# Altium footprint library ICs And Semiconductors THD.PcbLib: 507 footprints (part 13 of 32)
Each footprint in its own frame and in the unit in brackets; x right, y up, seen from the top. Pads: shape width x height; smd on the part's side, far side on the other; paste and mask are expansions set on the pad; w line width, h text height; cw(c..) or ccw(c..) is an arc to the next point about the centre after c.
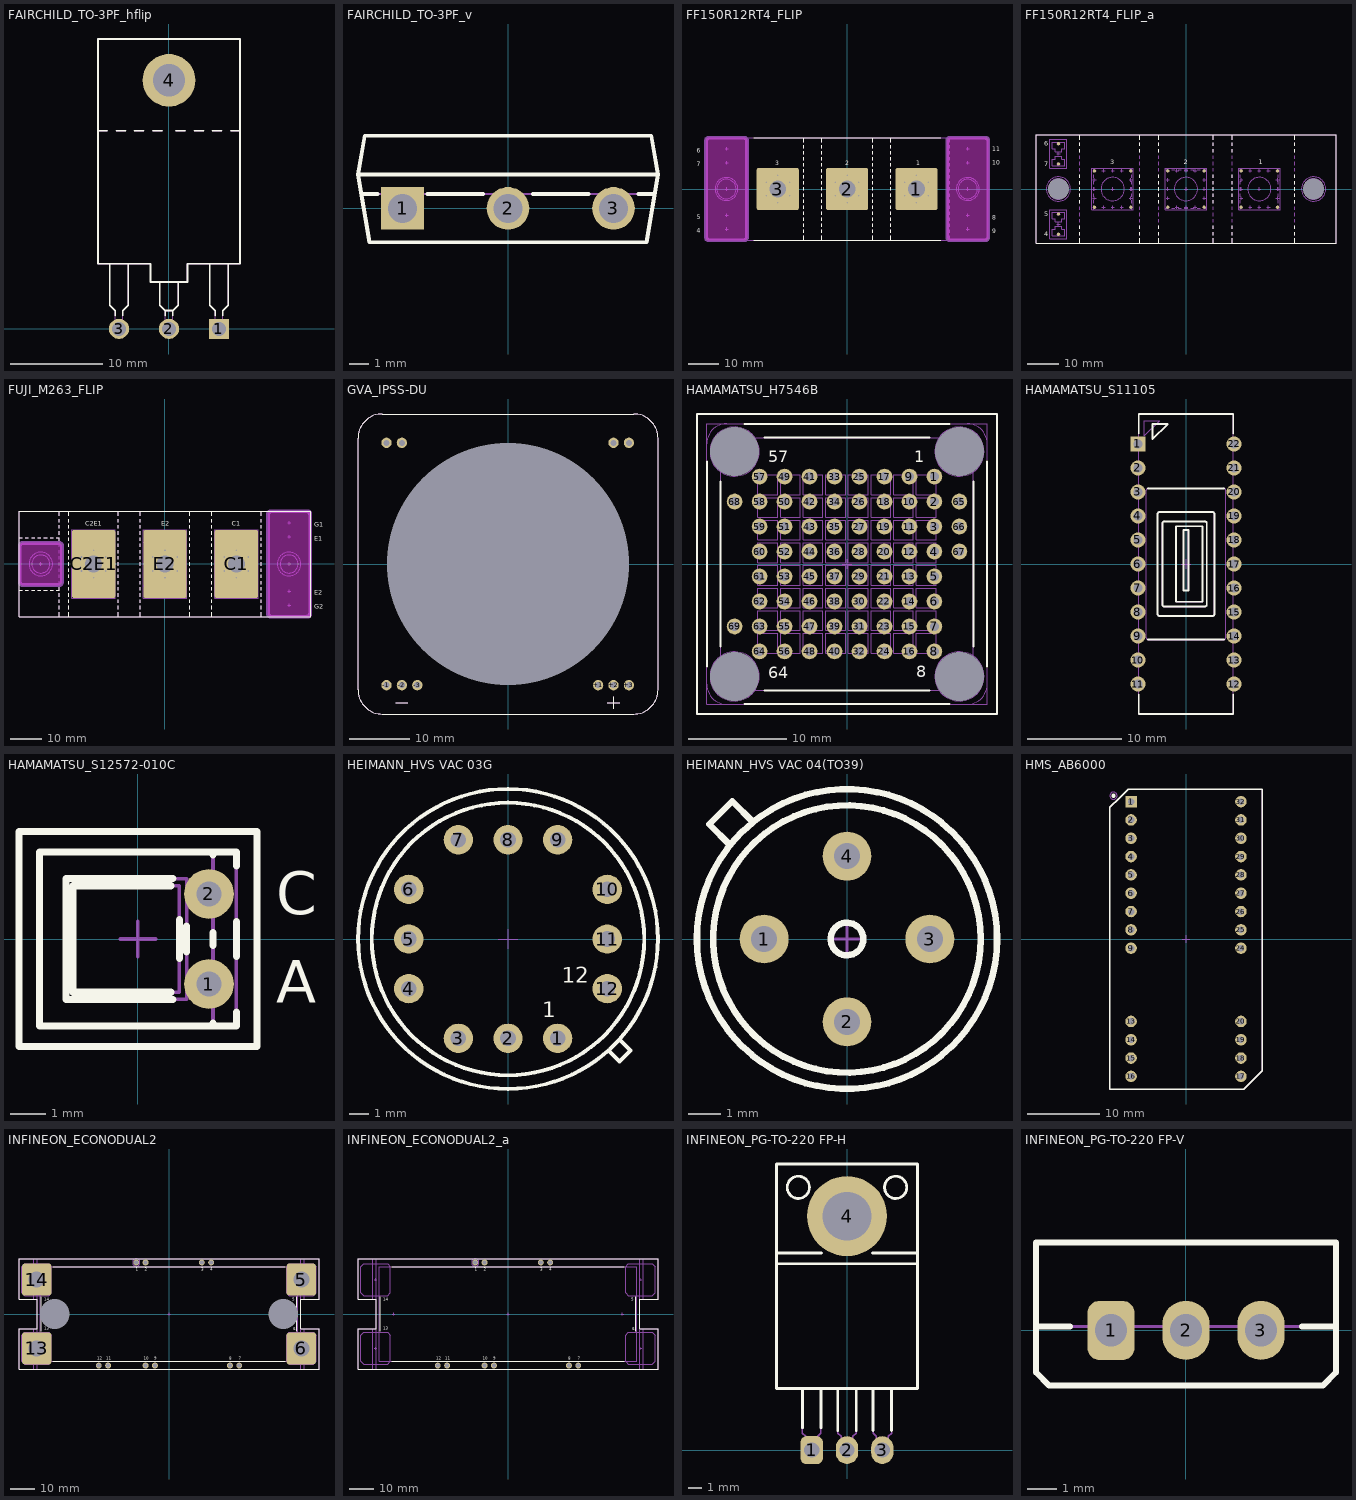
[diagram p12: the footprints below, top view; thin cyan lines are the x and y axes]

## FAIRCHILD_TO-3PF_hflip [mm] "FAIRCHILD TO-3PF 3-Terminal - Flipped Horizontal Mount"
height 5.7
pads (4):
  rect 2.2x2.2 hole 1.5: 1(5.45,0)
  round 2.2 hole 1.5: 2(0,0) 3(-5.45,0)
  round 5.75 hole 3.5: 4(0,27.1)
Top Overlay:
  lines w0.2: -7.75,21.6 -6.75,21.6 ; -6.45,7.1 -6.45,2.6 -5.85,2 -5.85,1.446 ; -5.75,21.6 -4.75,21.6 ; -5.05,1.446 -5.05,2 -4.45,2.6 -4.45,7.1 ; -3.75,21.6 -2.75,21.6 ; -1.75,21.6 -0.75,21.6 ; -1,5.1 -1,2.6 -0.4,2 ; -0.4,1.446 -0.4,2 ; 0.4,1.446 0.4,2 ; 0.75,21.6 1.75,21.6 ; 1,5.1 1,2.6 0.4,2 ; 2.75,21.6 3.75,21.6 ; 4.45,7.1 4.45,2.6 5.05,2 5.05,1.446 ; 4.75,21.6 5.75,21.6 ; 5.85,1.446 5.85,2 6.45,2.6 6.45,7.1 ; 6.75,21.6 7.75,21.6 ; -0.4,2 0.4,2 ; -7.75,7.1 -7.75,31.6 7.75,31.6 7.75,7.1 2,7.1 2,5.1 -2,5.1 -2,7.1 -7.75,7.1
Notvisible:
  lines w0.1: -6.45,0 -5.45,0 ; -5.45,-1 -5.45,0 ; -5.45,1 -5.45,0 ; -4.45,0 -5.45,0 ; -1,0 0,0 ; -1,27.1 0,27.1 ; 0,-1 0,0 ; 0,1 0,0 ; 0,26.1 0,27.1 ; 0,28.1 0,27.1 ; 1,0 0,0 ; 1,27.1 0,27.1 ; 4.45,0 5.45,0 ; 5.45,-1 5.45,0 ; 5.45,1 5.45,0 ; 6.45,0 5.45,0
Mechanical 14:
  circle w0.1: c0,27.1 r1.8
  lines w0.1: -7.75,21.6 -6.75,21.6 ; -6.45,7.1 -6.45,2.6 -5.85,2 -5.85,-0.45 -5.05,-0.45 -5.05,2 -4.45,2.6 -4.45,7.1 ; -5.75,21.6 -4.75,21.6 ; -3.75,21.6 -2.75,21.6 ; -1.75,21.6 -0.75,21.6 ; -1,5.1 -1,2.6 -0.4,2 ; 0.75,21.6 1.75,21.6 ; 1,5.1 1,2.6 0.4,2 ; 2.75,21.6 3.75,21.6 ; 4.45,7.1 4.45,2.6 5.05,2 5.05,-0.45 5.85,-0.45 5.85,2 6.45,2.6 6.45,7.1 ; 4.75,21.6 5.75,21.6 ; 6.75,21.6 7.75,21.6 ; -0.4,2 -0.4,-0.45 0.4,-0.45 0.4,2 ; -0.4,2 0.4,2 ; -7.75,7.1 -7.75,31.6 7.75,31.6 7.75,7.1 2,7.1 2,5.1 -2,5.1 -2,7.1 -7.75,7.1
3D body "FAIRCHILD_TO-3PF_hflip.stp": height 5.5, standoff -5.8, extent -7.75,-0.45 7.75,31.6

## FAIRCHILD_TO-3PF_v [mm] "FAIRCHILD TO-3PF 3-Terminal - Vertical Mount"
height 29.4
pads (3):
  rect 2.2x2.2 hole 1.5: 1(-5.45,0)
  round 2.2 hole 1.5: 2(0,0) 3(5.45,0)
Top Overlay:
  lines w0.2: -7.579,0.75 -6.749,0.75 ; -4.151,0.75 -1.299,0.75 ; 1.299,0.75 4.151,0.75 ; 6.749,0.75 7.579,0.75 ; -7.75,1.75 7.75,1.75 ; -7.75,1.75 -7.15,-1.75 7.15,-1.75 7.75,1.75 ; -7.75,1.75 -7.4,3.75 7.4,3.75 7.75,1.75
Notvisible:
  lines w0.1: -6.45,0 -5.45,0 ; -5.45,-1 -5.45,0 ; -5.45,1 -5.45,0 ; -4.45,0 -5.45,0 ; -1,0 0,0 ; 0,-1 0,0 ; 0,1 0,0 ; 1,0 0,0 ; 4.45,0 5.45,0 ; 5.45,-1 5.45,0 ; 5.45,1 5.45,0 ; 6.45,0 5.45,0
Mechanical 14:
  lines w0.1: -7.579,0.75 7.579,0.75 ; -7.75,1.75 7.75,1.75 ; -7.75,1.75 -7.15,-1.75 7.15,-1.75 7.75,1.75 ; -7.75,1.75 -7.4,3.75 7.4,3.75 7.75,1.75
3D body "FAIRCHILD_TO-3PF_v.stp": height 30.5, standoff -13.3, extent -7.75,-1.75 7.75,3.75

## FF150R12RT4_FLIP [mm] "34mm Module with Fast Trench/Fieldstop IGBT4 and Emitter Controlled 4 Diode, Body 94mm x 34mm, Screws on PCB Version"
height 30.5
pads (3):
  rrect10% 14x14 hole 5.5: 1(23,0) 2(0,0) 3(-23,0)
via 26.897,-2.25 diameter 1 hole 0.5
via 26.897,2.25 diameter 1 hole 0.5
via 19.103,-2.25 diameter 1 hole 0.5
via 23,4.5 diameter 1 hole 0.5
via 19.103,2.25 diameter 1 hole 0.5
via 23,-4.5 diameter 1 hole 0.5
via 0,-4.5 diameter 1 hole 0.5
via -3.897,2.25 diameter 1 hole 0.5
via 0,4.5 diameter 1 hole 0.5
via -3.897,-2.25 diameter 1 hole 0.5
via 3.897,2.25 diameter 1 hole 0.5
via 3.897,-2.25 diameter 1 hole 0.5
via -23,-4.5 diameter 1 hole 0.5
via -26.897,2.25 diameter 1 hole 0.5
via -23,4.5 diameter 1 hole 0.5
via -26.897,-2.25 diameter 1 hole 0.5
via -19.103,2.25 diameter 1 hole 0.5
via -19.103,-2.25 diameter 1 hole 0.5
Top Overlay:
  lines w0.2: -31,-16.992 31,-16.992 ; -31,17.003 31,17.003 ; -14.47,-16.992 -14.47,-15.494 ; -14.47,-14.494 -14.47,-13.494 ; -14.47,-12.494 -14.47,-11.494 ; -14.47,-10.494 -14.47,-9.494 ; -14.47,-8.494 -14.47,-7.494 ; -14.47,-6.494 -14.47,-5.494 ; -14.47,-4.494 -14.47,-3.494 ; -14.47,-2.494 -14.47,-1.494 ; -14.47,-0.494 -14.47,0.506 ; -14.47,1.506 -14.47,2.506 ; -14.47,3.506 -14.47,4.506 ; -14.47,5.506 -14.47,6.506 ; -14.47,7.506 -14.47,8.506 ; -14.47,9.506 -14.47,10.506 ; -14.47,11.506 -14.47,12.506 ; -14.47,13.506 -14.47,14.506 ; -14.47,15.506 -14.47,17.003 ; -8.47,-16.992 -8.47,-15.494 ; -8.47,-14.494 -8.47,-13.494 ; -8.47,-12.494 -8.47,-11.494 ; -8.47,-10.494 -8.47,-9.494 ; -8.47,-8.494 -8.47,-7.494 ; -8.47,-6.494 -8.47,-5.494 ; -8.47,-4.494 -8.47,-3.494 ; -8.47,-2.494 -8.47,-1.494 ; -8.47,-0.494 -8.47,0.506 ; -8.47,1.506 -8.47,2.506 ; -8.47,3.506 -8.47,4.506 ; -8.47,5.506 -8.47,6.506 ; -8.47,7.506 -8.47,8.506 ; -8.47,9.506 -8.47,10.506 ; -8.47,11.506 -8.47,12.506 ; -8.47,13.506 -8.47,14.506 ; -8.47,15.506 -8.47,17.003 ; 8.54,-16.992 8.54,-15.494 ; 8.54,-14.494 8.54,-13.494 ; 8.54,-12.494 8.54,-11.494 ; 8.54,-10.494 8.54,-9.494 ; 8.54,-8.494 8.54,-7.494 ; 8.54,-6.494 8.54,-5.494 ; 8.54,-4.494 8.54,-3.494 ; 8.54,-2.494 8.54,-1.494 ; 8.54,-0.494 8.54,0.506 ; 8.54,1.506 8.54,2.506 ; 8.54,3.506 8.54,4.506 ; 8.54,5.506 8.54,6.506 ; 8.54,7.506 8.54,8.506 ; 8.54,9.506 8.54,10.506 ; 8.54,11.506 8.54,12.506 ; 8.54,13.506 8.54,14.506 ; 8.54,15.506 8.54,17.003 ; 14.541,-16.992 14.541,-15.494 ; 14.541,-14.494 14.541,-13.494 ; 14.541,-12.494 14.541,-11.494 ; 14.541,-10.494 14.541,-9.494 ; 14.541,-8.494 14.541,-7.494 ; 14.541,-6.494 14.541,-5.494 ; 14.541,-4.494 14.541,-3.494 ; 14.541,-2.494 14.541,-1.494 ; 14.541,-0.494 14.541,0.506 ; 14.541,1.506 14.541,2.506 ; 14.541,3.506 14.541,4.506 ; 14.541,5.506 14.541,6.506 ; 14.541,7.506 14.541,8.506 ; 14.541,9.506 14.541,10.506 ; 14.541,11.506 14.541,12.506 ; 14.541,13.506 14.541,14.506 ; 14.541,15.506 14.541,17.003
  text "9" at 48.206,-14.668 h1.5
  text "8" at 48.206,-10.164 h1.5
  text "10" at 48.109,8.011 h1.5
  text "11" at 48.109,12.512 h1.5
  text "6" at -49.796,12.004 h1.5
  text "7" at -49.796,7.503 h1.5
  text "5" at -49.796,-10.037 h1.5
  text "4" at -49.796,-14.541 h1.5
  text "1" at 22.848,7.805 h1.5
  text "2" at -0.647,7.805 h1.5
  text "3" at -23.761,7.827 h1.5
Keep-Out Layer:
  board cut-out: 33.2,-16 33.2,-16.098 33.238,-16.292 33.314,-16.474 33.423,-16.637 33.563,-16.777 33.726,-16.886 33.908,-16.962 34.102,-17 34.2,-17 45.8,-17 45.899,-17 46.092,-16.962 46.274,-16.886 46.437,-16.777 46.577,-16.637 46.686,-16.474 46.762,-16.292 46.8,-16.098 46.8,-16 46.8,16 46.8,16.098 46.762,16.292 46.686,16.474 46.577,16.637 46.437,16.777 46.274,16.886 46.092,16.962 45.899,17 45.8,17 34.2,17 34.102,17 33.908,16.962 33.726,16.886 33.563,16.777 33.423,16.637 33.314,16.474 33.238,16.292 33.2,16.098 33.2,16
  board cut-out: -46.8,-16 -46.8,-16.098 -46.762,-16.292 -46.686,-16.474 -46.577,-16.637 -46.437,-16.777 -46.274,-16.886 -46.092,-16.962 -45.899,-17 -45.8,-17 -34.2,-17 -34.102,-17 -33.908,-16.962 -33.726,-16.886 -33.563,-16.777 -33.423,-16.637 -33.314,-16.474 -33.238,-16.292 -33.2,-16.098 -33.2,-16 -33.2,16 -33.2,16.098 -33.238,16.292 -33.314,16.474 -33.423,16.637 -33.563,16.777 -33.726,16.886 -33.908,16.962 -34.102,17 -34.2,17 -45.8,17 -45.899,17 -46.092,16.962 -46.274,16.886 -46.437,16.777 -46.577,16.637 -46.686,16.474 -46.762,16.292 -46.8,16.098 -46.8,16
Mechanical 1:
  lines w1.27: -46.8,-16 ccw(c-45.8,-16) -45.8,-17 -34.2,-17 ccw(c-34.2,-16) -33.2,-16 -33.2,16 ccw(c-34.2,16) -34.2,17 -45.8,17 ccw(c-45.8,16) -46.8,16 -46.8,-16 ; 33.2,-16 ccw(c34.2,-16) 34.2,-17 45.8,-17 ccw(c45.8,-16) 46.8,-16 46.8,16 ccw(c45.8,16) 45.8,17 34.2,17 ccw(c34.2,16) 33.2,16 33.2,-16
Notvisible:
  drawing of 151 lines, arcs and shapes, not listed
Mechanical 14:
  drawing of 194 lines, arcs and shapes, not listed
  text "9" at 48.206,-14.668 h1.5
  text "8" at 48.206,-10.164 h1.5
  text "10" at 48.109,8.011 h1.5
  text "11" at 48.109,12.512 h1.5
  text "6" at -49.796,12.004 h1.5
  text "7" at -49.796,7.503 h1.5
  text "5" at -49.796,-10.037 h1.5
  text "4" at -49.796,-14.541 h1.5
  text "1" at 22.848,7.805 h1.5
  text "2" at -0.647,7.805 h1.5
  text "3" at -23.761,7.827 h1.5
Drill Drawing:
  lines w0.1: -46.2,5.878 -46.8,6.096 ; -46.2,6.314 -46.8,6.096 ; -43.652,-16.4 -43.434,-17 ; -43.652,16.4 -43.434,17 ; -43.216,-16.4 -43.434,-17 ; -43.216,16.4 -43.434,17 ; -40.5,0 -40,0 ; -40,-0.5 -40,0 ; -40,0.5 -40,0 ; -39.5,0 -40,0 ; -39.37,-15.886 -34.152,-15.886 -33.401,-16.637 ; -34.307,-16.214 -33.401,-16.637 ; -33.824,-15.731 -33.401,-16.637 ; -33.8,5.878 -33.2,6.096 ; -33.8,6.314 -33.2,6.096 ; 33.8,5.878 33.2,6.096 ; 33.8,6.314 33.2,6.096 ; 36.348,-16.4 36.566,-17 ; 36.348,16.4 36.566,17 ; 36.784,-16.4 36.566,-17 ; 36.784,16.4 36.566,17 ; 39.5,0 40,0 ; 40,-0.5 40,0 ; 40,0.5 40,0 ; 40.5,0 40,0 ; 40.63,-15.886 45.848,-15.886 46.599,-16.637 ; 45.693,-16.214 46.599,-16.637 ; 46.176,-15.731 46.599,-16.637 ; 46.2,5.878 46.8,6.096 ; 46.2,6.314 46.8,6.096 ; -46.8,6.096 -33.2,6.096 ; -43.434,-17 -43.434,17 ; 33.2,-16 ccw(c34.2,-16) 34.2,-17 ; 33.2,-16 ccw(c34.2,-16) 34.2,-17 ; 33.2,-16 33.2,16 ; 33.2,-16 33.2,16 ; 33.2,6.096 46.8,6.096 ; 33.2,16 cw(c34.2,16) 34.2,17 ; 33.2,16 cw(c34.2,16) 34.2,17 ; 34.2,-17 45.8,-17 ; 34.2,-17 45.8,-17 ; 34.2,17 45.8,17 ; 34.2,17 45.8,17 ; 36.566,-17 36.566,17 ; 45.8,-17 ccw(c45.8,-16) 46.8,-16 ; 45.8,-17 ccw(c45.8,-16) 46.8,-16 ; 45.8,17 cw(c45.8,16) 46.8,16 ; 45.8,17 cw(c45.8,16) 46.8,16 ; 46.8,-16 46.8,16 ; 46.8,-16 46.8,16 ; -46.8,-16 ccw(c-45.8,-16) -45.8,-17 -34.2,-17 ccw(c-34.2,-16) -33.2,-16 -33.2,16 ccw(c-34.2,16) -34.2,17 -45.8,17 ccw(c-45.8,16) -46.8,16 -46.8,-16
  text "34mm" at -43.942,-0.635 h0.9
  text "13.6mm" at -39.243,6.604 h0.9
  text "r =1mm" at -39.243,-15.621 h0.9
  text "r =1mm" at 40.757,-15.621 h0.9
  text "13.6mm" at 40.757,6.604 h0.9
  text "34mm" at 36.058,-0.635 h0.9
3D body "FF150R12RT4.stp": height 30.51, standoff -0.05, extent -47.035,-17.003 46.965,16.992
3D body "FF150R12RT4_FLIP_Part2.stp": height 10.4, standoff -5.27, extent -27.75,-4.75 27.75,4.75

## FF150R12RT4_FLIP_a [mm] "34mm Module with Fast Trench/Fieldstop IGBT4 and Emitter Controlled 4 Diode, Body 94mm x 34mm (To Be Used With Wurth 93456 + 7460550)"
height 30.5
pads (18):
  round 1 smd paste-0.5: 1(17.3,-5.7) 1(17.3,5.7) 1(28.7,-5.7) 1(28.7,5.7) 2(-5.7,-5.7) 2(-5.7,5.7) 2(5.7,-5.7) 2(5.7,5.7) 3(-28.7,-5.7) 3(-28.7,5.7) 3(-17.3,-5.7) 3(-17.3,5.7) 4(-40,-14.191) 5(-40,-7.841) 6(-40,14.203) 7(-40,7.853)
  round 1 hole 6.5 unplated mask+2.75: P1(-40,0) P2(40,0)
Top Overlay:
  lines w0.2: -33.349,-16.992 -33.349,-15.494 ; -33.349,-14.494 -33.349,-13.494 ; -33.349,-12.494 -33.349,-11.494 ; -33.349,-4.494 -33.349,-3.494 ; -33.349,-2.494 -33.349,-1.494 ; -33.349,-0.494 -33.349,0.506 ; -33.349,1.506 -33.349,2.506 ; -33.349,3.506 -33.349,4.506 ; -33.349,11.506 -33.349,12.506 ; -33.349,13.506 -33.349,14.506 ; -33.349,15.506 -33.349,17.003 ; -14.47,-16.992 -14.47,-15.494 ; -14.47,-14.494 -14.47,-13.494 ; -14.47,-12.494 -14.47,-11.494 ; -14.47,-4.494 -14.47,-3.494 ; -14.47,-2.494 -14.47,-1.494 ; -14.47,-0.494 -14.47,0.506 ; -14.47,1.506 -14.47,2.506 ; -14.47,3.506 -14.47,4.506 ; -14.47,11.506 -14.47,12.506 ; -14.47,13.506 -14.47,14.506 ; -14.47,15.506 -14.47,17.003 ; -8.47,-16.992 -8.47,-15.494 ; -8.47,-14.494 -8.47,-13.494 ; -8.47,-12.494 -8.47,-11.494 ; -8.47,-4.494 -8.47,-3.494 ; -8.47,-2.494 -8.47,-1.494 ; -8.47,-0.494 -8.47,0.506 ; -8.47,1.506 -8.47,2.506 ; -8.47,3.506 -8.47,4.506 ; -8.47,11.506 -8.47,12.506 ; -8.47,13.506 -8.47,14.506 ; -8.47,15.506 -8.47,17.003 ; 8.54,-16.992 8.54,-15.494 ; 8.54,-14.494 8.54,-13.494 ; 8.54,-12.494 8.54,-11.494 ; 8.54,-4.494 8.54,-3.494 ; 8.54,-2.494 8.54,-1.494 ; 8.54,-0.494 8.54,0.506 ; 8.54,1.506 8.54,2.506 ; 8.54,3.506 8.54,4.506 ; 8.54,11.506 8.54,12.506 ; 8.54,13.506 8.54,14.506 ; 8.54,15.506 8.54,17.003 ; 14.541,-16.992 14.541,-15.494 ; 14.541,-14.494 14.541,-13.494 ; 14.541,-12.494 14.541,-11.494 ; 14.541,-4.494 14.541,-3.494 ; 14.541,-2.494 14.541,-1.494 ; 14.541,-0.494 14.541,0.506 ; 14.541,1.506 14.541,2.506 ; 14.541,3.506 14.541,4.506 ; 14.541,11.506 14.541,12.506 ; 14.541,13.506 14.541,14.506 ; 14.541,15.506 14.541,17.003 ; 34.055,-16.992 34.055,-15.494 ; 34.055,-14.494 34.055,-13.494 ; 34.055,-12.494 34.055,-11.494 ; 34.055,-4.494 34.055,-3.494 ; 34.055,-2.494 34.055,-1.494 ; 34.055,-0.494 34.055,0.506 ; 34.055,1.506 34.055,2.506 ; 34.055,3.506 34.055,4.506 ; 34.055,11.506 34.055,12.506 ; 34.055,13.506 34.055,14.506 ; 34.055,15.506 34.055,17.003 ; -47.035,-16.992 -47.035,17.003 47.035,17.003 47.035,-16.992 -47.035,-16.992
  text "6" at -44.4,13.506 h1.5
  text "7" at -44.4,7.156 h1.5
  text "5" at -44.5,-8.538 h1.5
  text "4" at -44.5,-14.888 h1.5
  text "1" at 22.848,7.805 h1.5
  text "2" at -0.647,7.805 h1.5
  text "3" at -23.761,7.827 h1.5
Notvisible:
  drawing of 291 lines, arcs and shapes, not listed
Mechanical 14:
  drawing of 194 lines, arcs and shapes, not listed
  text "6" at -44.4,13.506 h1.5
  text "7" at -44.4,7.156 h1.5
  text "5" at -44.5,-8.538 h1.5
  text "4" at -44.5,-14.888 h1.5
  text "1" at 22.848,7.805 h1.5
  text "2" at -0.647,7.805 h1.5
  text "3" at -23.761,7.827 h1.5
3D body "FF150R12RT4.stp": height 33.61, standoff 3.05, extent -47.035,-17.003 46.965,16.992

## FUJI_M263_FLIP [mm] "IGBT Module, Body 94mm x 34mm, Screws on PCB Version"
height 30.8
pads (3):
  rrect10% 14x22 / inner rrect10% 14x14 / far side rrect10% 14x14 hole 5.5: C1(23,0) C2E1(-23,0) E2(0,0)
via 26.897,-2.25 diameter 1 hole 0.5
via 26.897,2.25 diameter 1 hole 0.5
via 19.103,-2.25 diameter 1 hole 0.5
via 23,4.5 diameter 1 hole 0.5
via 19.103,2.25 diameter 1 hole 0.5
via 23,-4.5 diameter 1 hole 0.5
via 0,-4.5 diameter 1 hole 0.5
via -3.897,2.25 diameter 1 hole 0.5
via 0,4.5 diameter 1 hole 0.5
via -3.897,-2.25 diameter 1 hole 0.5
via 3.897,2.25 diameter 1 hole 0.5
via 3.897,-2.25 diameter 1 hole 0.5
via -23,-4.5 diameter 1 hole 0.5
via -26.897,2.25 diameter 1 hole 0.5
via -23,4.5 diameter 1 hole 0.5
via -26.897,-2.25 diameter 1 hole 0.5
via -19.103,2.25 diameter 1 hole 0.5
via -19.103,-2.25 diameter 1 hole 0.5
Top Overlay:
  lines w0.2: -47.035,-8.515 -45.984,-8.515 ; -47.035,8.515 -45.993,8.515 ; -44.993,8.515 -43.993,8.515 ; -44.984,-8.515 -43.984,-8.515 ; -42.993,8.515 -41.993,8.515 ; -42.984,-8.515 -41.984,-8.515 ; -40.993,8.515 -39.993,8.515 ; -40.984,-8.515 -39.984,-8.515 ; -38.993,8.515 -37.993,8.515 ; -38.984,-8.515 -37.984,-8.515 ; -36.993,8.515 -35.993,8.515 ; -36.984,-8.515 -35.984,-8.515 ; -34.993,8.515 -34.063,8.515 ; -34.984,-8.515 -34.055,-8.515 ; -34.055,-17.003 -34.055,-15.506 ; -34.055,-14.506 -34.055,-13.506 ; -34.055,-12.506 -34.055,-11.506 ; -34.055,-10.506 -34.055,-9.506 ; -34.055,-8.506 -34.055,-7.506 ; -34.055,7.494 -34.055,8.494 ; -34.055,9.494 -34.055,10.494 ; -34.055,11.494 -34.055,12.494 ; -34.055,13.494 -34.055,14.494 ; -34.055,15.494 -34.055,16.992 ; -31,-17.003 -31,-15.506 ; -31,-14.506 -31,-13.506 ; -31,-12.506 -31,-11.506 ; -31,-10.506 -31,-9.506 ; -31,-8.506 -31,-7.506 ; -31,-6.506 -31,-5.506 ; -31,-4.506 -31,-3.506 ; -31,-2.506 -31,-1.506 ; -31,-0.506 -31,0.494 ; -31,1.494 -31,2.494 ; -31,3.494 -31,4.494 ; -31,5.494 -31,6.494 ; -31,7.494 -31,8.494 ; -31,9.494 -31,10.494 ; -31,11.494 -31,12.494 ; -31,13.494 -31,14.494 ; -31,15.494 -31,16.992 ; -15,-17.003 -15,-15.506 ; -15,-14.506 -15,-13.506 ; -15,-12.506 -15,-11.506 ; -15,-10.506 -15,-9.506 ; -15,-8.506 -15,-7.506 ; -15,-6.506 -15,-5.506 ; -15,-4.506 -15,-3.506 ; -15,-2.506 -15,-1.506 ; -15,-0.506 -15,0.494 ; -15,1.494 -15,2.494 ; -15,3.494 -15,4.494 ; -15,5.494 -15,6.494 ; -15,7.494 -15,8.494 ; -15,9.494 -15,10.494 ; -15,11.494 -15,12.494 ; -15,13.494 -15,14.494 ; -15,15.494 -15,16.992 ; -7.97,-17.003 -7.97,-15.506 ; -7.97,-14.506 -7.97,-13.506 ; -7.97,-12.506 -7.97,-11.506 ; -7.97,-10.506 -7.97,-9.506 ; -7.97,-8.506 -7.97,-7.506 ; -7.97,-6.506 -7.97,-5.506 ; -7.97,-4.506 -7.97,-3.506 ; -7.97,-2.506 -7.97,-1.506 ; -7.97,-0.506 -7.97,0.494 ; -7.97,1.494 -7.97,2.494 ; -7.97,3.494 -7.97,4.494 ; -7.97,5.494 -7.97,6.494 ; -7.97,7.494 -7.97,8.494 ; -7.97,9.494 -7.97,10.494 ; -7.97,11.494 -7.97,12.494 ; -7.97,13.494 -7.97,14.494 ; -7.97,15.494 -7.97,16.992 ; 8.04,-17.003 8.04,-15.506 ; 8.04,-14.506 8.04,-13.506 ; 8.04,-12.506 8.04,-11.506 ; 8.04,-10.506 8.04,-9.506 ; 8.04,-8.506 8.04,-7.506 ; 8.04,-6.506 8.04,-5.506 ; 8.04,-4.506 8.04,-3.506 ; 8.04,-2.506 8.04,-1.506 ; 8.04,-0.506 8.04,0.494 ; 8.04,1.494 8.04,2.494 ; 8.04,3.494 8.04,4.494 ; 8.04,5.494 8.04,6.494 ; 8.04,7.494 8.04,8.494 ; 8.04,9.494 8.04,10.494 ; 8.04,11.494 8.04,12.494 ; 8.04,13.494 8.04,14.494 ; 8.04,15.494 8.04,16.992 ; 15,-17.003 15,-15.506 ; 15,-14.506 15,-13.506 ; 15,-12.506 15,-11.506 ; 15,-10.506 15,-9.506 ; 15,-8.506 15,-7.506 ; 15,-6.506 15,-5.506 ; 15,-4.506 15,-3.506 ; 15,-2.506 15,-1.506 ; 15,-0.506 15,0.494 ; 15,1.494 15,2.494 ; 15,3.494 15,4.494 ; 15,5.494 15,6.494 ; 15,7.494 15,8.494 ; 15,9.494 15,10.494 ; 15,11.494 15,12.494 ; 15,13.494 15,14.494 ; 15,15.494 15,16.992 ; 31,-17.003 31,-15.506 ; 31,-14.506 31,-13.506 ; 31,-12.506 31,-11.506 ; 31,-10.506 31,-9.506 ; 31,-8.506 31,-7.506 ; 31,-6.506 31,-5.506 ; 31,-4.506 31,-3.506 ; 31,-2.506 31,-1.506 ; 31,-0.506 31,0.494 ; 31,1.494 31,2.494 ; 31,3.494 31,4.494 ; 31,5.494 31,6.494 ; 31,7.494 31,8.494 ; 31,9.494 31,10.494 ; 31,11.494 31,12.494 ; 31,13.494 31,14.494 ; 31,15.494 31,16.992 ; -47.035,-17.003 47.035,-17.003 47.035,16.992 -47.035,16.992 -47.035,-17.003
  text "G1" at 48.121,12.004 h1.5
  text "E1" at 48.121,7.503 h1.5
  text "E2" at 48.121,-9.943 h1.5
  text "G2" at 48.121,-14.446 h1.5
  text "C2E1" at 20.689,7.805 h1.5
  text "E2" at -1.282,7.805 h1.5
  text "C2" at -24.396,7.827 h1.5
  text "C2E1" at -25.666,12.272 h1.5
  text "E2" at -1.142,12.272 h1.5
  text "C1" at 21.55,12.327 h1.5
Keep-Out Layer:
  board cut-out: 33.2,-16 33.2,-16.098 33.238,-16.292 33.314,-16.474 33.423,-16.637 33.563,-16.777 33.726,-16.886 33.908,-16.962 34.102,-17 34.2,-17 45.8,-17 45.899,-17 46.092,-16.962 46.274,-16.886 46.437,-16.777 46.577,-16.637 46.686,-16.474 46.762,-16.292 46.8,-16.098 46.8,-16 46.8,16 46.8,16.098 46.762,16.292 46.686,16.474 46.577,16.637 46.437,16.777 46.274,16.886 46.092,16.962 45.899,17 45.8,17 34.2,17 34.102,17 33.908,16.962 33.726,16.886 33.563,16.777 33.423,16.637 33.314,16.474 33.238,16.292 33.2,16.098 33.2,16
  board cut-out: -45.8,-6.8 -45.899,-6.8 -46.092,-6.762 -46.274,-6.686 -46.437,-6.577 -46.577,-6.437 -46.686,-6.274 -46.762,-6.092 -46.8,-5.898 -46.8,-5.8 -46.8,5.8 -46.8,5.898 -46.762,6.092 -46.686,6.274 -46.577,6.437 -46.437,6.577 -46.274,6.686 -46.092,6.762 -45.899,6.8 -45.8,6.8 -34.2,6.8 -34.102,6.8 -33.908,6.762 -33.726,6.686 -33.563,6.577 -33.423,6.437 -33.314,6.274 -33.238,6.092 -33.2,5.898 -33.2,5.8 -33.2,-5.8 -33.2,-5.898 -33.238,-6.092 -33.314,-6.274 -33.423,-6.437 -33.563,-6.577 -33.726,-6.686 -33.908,-6.762 -34.102,-6.8 -34.2,-6.8
Mechanical 1:
  lines w1.27: -46.8,-5.8 ccw(c-45.8,-5.8) -45.8,-6.8 -34.2,-6.8 ccw(c-34.2,-5.8) -33.2,-5.8 -33.2,5.8 ccw(c-34.2,5.8) -34.2,6.8 -45.8,6.8 ccw(c-45.8,5.8) -46.8,5.8 -46.8,-5.8 ; 33.2,-16 ccw(c34.2,-16) 34.2,-17 45.8,-17 ccw(c45.8,-16) 46.8,-16 46.8,16 ccw(c45.8,16) 45.8,17 34.2,17 ccw(c34.2,16) 33.2,16 33.2,-16
Notvisible:
  drawing of 155 lines, arcs and shapes, not listed
Mechanical 14:
  drawing of 257 lines, arcs and shapes, not listed
  text "G1" at 48.121,12.004 h1.5
  text "E1" at 48.121,7.503 h1.5
  text "E2" at 48.121,-9.943 h1.5
  text "G2" at 48.121,-14.446 h1.5
  text "C2E1" at 20.689,7.805 h1.5
  text "E2" at -1.282,7.805 h1.5
  text "C2" at -24.396,7.827 h1.5
  text "C2E1" at -25.666,12.272 h1.5
  text "E2" at -1.142,12.272 h1.5
  text "C1" at 21.55,12.327 h1.5
Drill Drawing:
  lines w0.1: -46.2,4.481 -46.8,4.699 ; -46.2,4.917 -46.8,4.699 ; -43.652,-6.2 -43.434,-6.8 ; -43.652,6.2 -43.434,6.8 ; -43.216,-6.2 -43.434,-6.8 ; -43.216,6.2 -43.434,6.8 ; -40.5,0 -40,0 ; -40,-0.5 -40,0 ; -40,0.5 -40,0 ; -39.5,0 -40,0 ; -39.497,-5.754 -34.279,-5.754 -33.528,-6.506 ; -34.434,-6.083 -33.528,-6.506 ; -33.951,-5.599 -33.528,-6.506 ; -33.8,4.481 -33.2,4.699 ; -33.8,4.917 -33.2,4.699 ; 33.8,5.878 33.2,6.096 ; 33.8,6.314 33.2,6.096 ; 36.348,-16.4 36.566,-17 ; 36.348,16.4 36.566,17 ; 36.784,-16.4 36.566,-17 ; 36.784,16.4 36.566,17 ; 39.5,0 40,0 ; 40,-0.5 40,0 ; 40,0.5 40,0 ; 40.5,0 40,0 ; 40.63,-15.886 45.848,-15.886 46.599,-16.637 ; 45.693,-16.214 46.599,-16.637 ; 46.176,-15.731 46.599,-16.637 ; 46.2,5.878 46.8,6.096 ; 46.2,6.314 46.8,6.096 ; -46.8,4.699 -33.2,4.699 ; -43.434,-6.8 -43.434,6.8 ; 33.2,-16 ccw(c34.2,-16) 34.2,-17 ; 33.2,-16 ccw(c34.2,-16) 34.2,-17 ; 33.2,-16 33.2,16 ; 33.2,-16 33.2,16 ; 33.2,6.096 46.8,6.096 ; 33.2,16 cw(c34.2,16) 34.2,17 ; 33.2,16 cw(c34.2,16) 34.2,17 ; 34.2,-17 45.8,-17 ; 34.2,-17 45.8,-17 ; 34.2,17 45.8,17 ; 34.2,17 45.8,17 ; 36.566,-17 36.566,17 ; 45.8,-17 ccw(c45.8,-16) 46.8,-16 ; 45.8,-17 ccw(c45.8,-16) 46.8,-16 ; 45.8,17 cw(c45.8,16) 46.8,16 ; 45.8,17 cw(c45.8,16) 46.8,16 ; 46.8,-16 46.8,16 ; 46.8,-16 46.8,16
  text "13.6mm" at -43.942,-0.635 h0.9
  text "13.6mm" at -39.243,5.207 h0.9
  text "r =1mm" at 40.757,-15.621 h0.9
  text "13.6mm" at 40.757,6.604 h0.9
  text "34mm" at 36.058,-0.635 h0.9
  text "r =1mm" at -39.37,-5.49 h0.9
3D body "FF150R12RT4_FLIP_Part2.stp": height 10.4, standoff -5.27, extent -27.75,-4.75 27.75,4.75
3D body "FUJI_M263.stp": height 30.51, standoff -0.05, extent -46.965,-16.992 47.035,17.003
